# Altium footprint library Connectors.PcbLib: 155 footprints (part 5 of 10)
Each footprint in its own frame and in the unit in brackets; x right, y up, seen from the top. Pads: shape width x height; smd on the part's side, far side on the other; paste and mask are expansions set on the pad; w line width, h text height; cw(c..) or ccw(c..) is an arc to the next point about the centre after c.
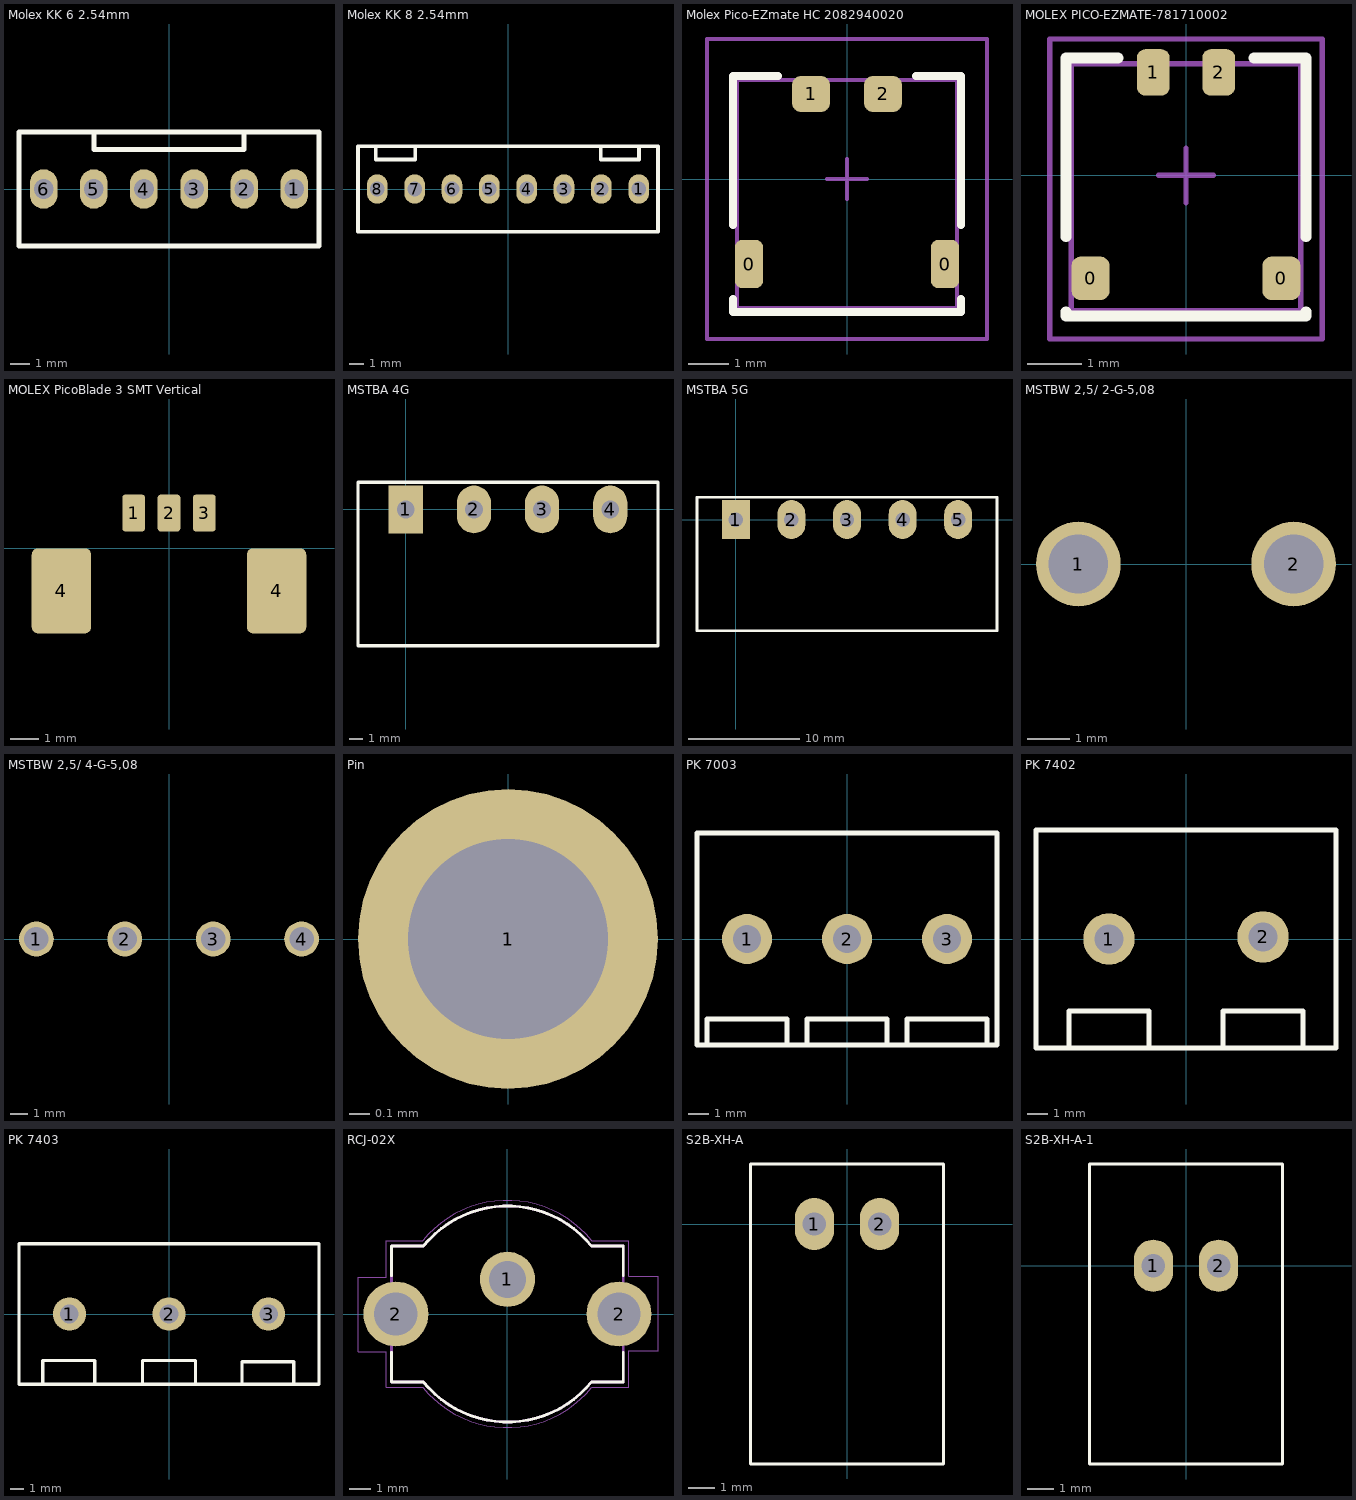
[diagram p4: the footprints below, top view; thin cyan lines are the x and y axes]

## Molex KK 6 2.54mm [mm] "Molex KK 6 2.54mm"
height 11.7
pads (6):
  oval 1.4x2 hole 1: 1(6.35,0) 2(3.81,0) 3(1.27,0) 4(-1.27,0) 5(-3.81,0) 6(-6.35,0)
Top Overlay:
  lines w0.254: -3.8,2.9 -3.8,2 3.8,2 3.8,2.9 ; -7.6,-2.9 -7.6,2.9 7.6,2.9 7.6,-2.9 -7.6,-2.9
3D body: height 11.72, standoff -3.54, extent -7.6,-2.9 7.64,2.9

## Molex KK 8 2.54mm [mm] "Molex KK 8 2.54mm"
height 11.7
pads (8):
  oval 1.4x2 hole 1: 1(8.89,0) 2(6.35,0) 3(3.81,0) 4(1.27,0) 5(-1.27,0) 6(-3.81,0) 7(-6.35,0) 8(-8.89,0)
Top Overlay:
  lines w0.254: -9,2.9 -9,2 -6.3,2 -6.3,2.9 ; 6.3,2.9 6.3,2 8.9,2 8.9,2.9 ; -10.2,-2.9 -10.2,2.9 10.2,2.9 10.2,-2.9 -10.2,-2.9
3D body: height 11.72, standoff -3.54, extent -10.16,-2.9 10.16,2.9

## Molex Pico-EZmate HC 2082940020 [mm]
height 1.65
pads (4):
  rrect50% 0.7x1.2 smd: 0(-2.45,-2.125) 0(2.45,-2.125)
  rrect50% 0.95x0.9 smd: 1(-0.9,2.125) 2(0.9,2.125)
Top Overlay:
  lines w0.2: -2.85,-3.325 -2.85,-3 ; -2.85,-1.15 -2.85,2.575 -1.725,2.575 ; -2.8,-3.325 2.85,-3.325 2.85,-3 ; 1.725,2.575 2.85,2.575 2.85,-1.15
Mechanical 13:
  lines w0.1: -2.75,-3.225 2.75,-3.225 2.75,2.475 -2.75,2.475 -2.75,-3.225
Mechanical 15:
  lines w0.1: -0.5,0 0.5,0 ; 0,-0.5 0,0.5 ; -3.5,-4 3.5,-4 3.5,3.5 -3.5,3.5 -3.5,-4
3D body: height 1.55, standoff -0.05, extent -2.75,-3.225 2.75,2.475

## MOLEX PICO-EZMATE-781710002 [mm] "1.20mm Pitch, Pico-EZmate PCB Header, Single Row, Gold Plating, Friction Lock, 2 Circuits, Tape and Reel"
height 1.55
pads (4):
  rrect50% 0.7x0.8 smd: 0(-1.75,-1.887) 0(1.75,-1.887)
  rrect50% 0.6x0.85 smd: 1(-0.6,1.887) 2(0.6,1.887)
Top Overlay:
  lines w0.2: -2.2,-2.5 -2.2,-2.575 2.2,-2.575 2.2,-2.5 ; -2.2,-1.125 -2.2,2.15 -1.25,2.15 ; 1.25,2.15 2.2,2.15 2.2,-1.125
Mechanical 13:
  lines w0.1: -2.1,-2.485 2.1,-2.485 2.1,2.045 -2.1,2.045 -2.1,-2.485
Mechanical 15:
  lines w0.1: -0.5,0 0.5,0 ; 0,-0.5 0,0.5 ; -2.5,-3 -2.5,2.5 2.5,2.5 2.5,-3 -2.5,-3
3D body: height 1.4, standoff -0.05, extent -2.1,-2.485 2.1,2.045

## MOLEX PicoBlade 3 SMT Vertical [mm] "53398-0371"
height 4.7
pads (5):
  rrect25% 0.8x1.3 smd: 1(-1.25,1.25) 2(0,1.25) 3(1.25,1.25)
  rrect20% 2.1x3 smd: 4(-3.8,-1.5) 4(3.8,-1.5)
3D body: height 4.72, standoff 0.02, extent -4.45,-2.625 4.45,1.575

## MSTBA 4G [mm] "MSTBA 4G"
height 6
pads (4):
  rect 2.5x3.5 hole 1.3: 1(0,0)
  oval 2.5x3.5 hole 1.3: 2(5,0) 3(10,0) 4(15,0)
Top Overlay:
  lines w0.254: -3.5,-10 -3,-10 18.5,-10 18.5,2 -3.5,2 -3.5,-10
3D body: height 8.6, standoff -3.5, extent -3.5,-10 18.5,2

## MSTBA 5G [mm] "MSTBA 5G"
height 6
pads (5):
  rect 2.5x3.5 hole 1.3: 1(0,0)
  oval 2.5x3.5 hole 1.3: 2(5,0) 3(10,0) 4(15,0) 5(20,0)
Top Overlay:
  lines w0.254: -3.5,-10 -3,-10 23.5,-10 23.5,2 -3.5,2 -3.5,-10
3D body: height 8.6, standoff -3.5, extent -3.5,-10 23.5,2

## MSTBW 2,5/ 2-G-5,08 [mm] "MSTBW 2,5/ 2-G-5,08 PCB header with extended standoff"
height 12.42
pads (2):
  round 2 hole 1.4: 1(-2.54,0) 2(2.54,0)
3D body: height 12.42, standoff -3.5, extent -5.08,-10 5.08,2

## MSTBW 2,5/ 4-G-5,08 [mm] "MSTBW 2,5/ 4-G-5,08 PCB header with extended standoff"
height 12.42
pads (4):
  round 2 hole 1.4: 1(-7.62,0) 2(-2.54,0) 3(2.54,0) 4(7.62,0)
3D body: height 12.42, standoff -3.5, extent -10.16,-10 10.16,2

## Pin [mm] "Simple pin"
pads (1):
  round 1.5 hole 1: 1(0,0)

## PK 7003 [mm] "PK 7003"
height 19
pads (3):
  round 2.5 hole 1.4: 1(-5,0) 2(0,0) 3(5,0)
Top Overlay:
  lines w0.254: -7,-5.3 -7,-4 -3,-4 -3,-5.3 ; -2,-5.3 -2,-4 2,-4 2,-5.3 ; 3,-5.3 3,-4 7,-4 7,-5.3 ; -7.5,-5.3 -7.5,5.3 7.5,5.3 7.5,-5.3 -7.5,-5.3
3D body: height 19, standoff -1, extent -7.5,-5.25 7.5,5.25

## PK 7402 [mm] "PK 7402"
height 19
pads (2):
  round 2.5 hole 1.4: 1(-3.75,0) 2(3.75,0.1)
Top Overlay:
  lines w0.254: -5.7,-5.3 -5.7,-3.5 -1.8,-3.5 -1.8,-5.3 ; 1.8,-5.3 1.8,-3.5 5.7,-3.5 5.7,-5.3 ; -7.3,-5.3 7.3,-5.3 7.3,5.3 -7.3,5.3 -7.3,-5.3
3D body: height 19, standoff -1, extent -7.25,-5.25 7.25,5.25

## PK 7403 [mm] "PK 7403"
height 19
pads (3):
  round 2.5 hole 1.4: 1(-7.5,0) 2(0,0) 3(7.5,0)
Top Overlay:
  lines w0.254: -9.5,-5.3 -9.5,-3.5 -5.6,-3.5 -5.6,-5.3 ; -2,-5.3 -2,-3.5 0,-3.5 1.7,-3.5 2,-3.5 2,-5.3 ; 5.5,-5.3 5.5,-3.6 9.4,-3.6 9.4,-5.3 ; -11.3,-5.3 -11.3,5.3 11.3,5.3 11.3,-5.3 -11.3,-5.3
3D body: height 19, standoff -1, extent -11.25,-5.25 11.25,5.25

## RCJ-02X [mm] "RCA connector"
height 15.8
pads (3):
  round 2.55 hole 1.7: 1(0,1.6)
  round 3 hole 2: 2(-5.15,0) 2(5.15,0)
Top Overlay:
  lines w0.127: -5.35,-1.765 -5.35,-3.135 -3.884,-3.135 ; -5.35,1.765 -5.35,3.135 -3.884,3.135 ; -3.886,-3.133 ccw(c0,0.014) 3.886,-3.133 ; -3.886,3.133 cw(c0,-0.014) 3.886,3.133 ; 3.884,3.135 5.35,3.135 5.35,1.765 ; 3.904,-3.135 5.35,-3.135 5.35,-1.765
Mechanical 13:
  lines w0.127: -3.886,-3.133 ccw(c0,0.014) 3.886,-3.133 ; -3.886,3.133 cw(c0,-0.014) 3.886,3.133 ; -3.884,-3.135 -5.35,-3.135 -5.35,3.135 -3.884,3.135 ; 3.884,3.135 5.35,3.135 5.35,-3.135 3.904,-3.135
Mechanical 15:
  lines w0.05: -5.605,3.385 -5.6,3.385 ; -3.905,3.383 cw(c-0.004,0.224) 3.897,3.383 ; -3.903,-3.383 ccw(c-0.002,-0.224) 3.899,-3.383 ; -3.903,3.385 -5.6,3.385 ; -3.901,-3.385 -5.6,-3.385 -5.6,-1.75 -6.9,-1.75 -6.9,1.7 -5.6,1.7 -5.6,3.385 ; 3.895,3.385 5.6,3.385 5.6,1.75 6.95,1.75 6.95,-1.7 5.6,-1.7 5.6,-3.385 3.904,-3.385
3D body: height 15.95, standoff -6.15, extent -6.477,-5 6.477,5

## S2B-XH-A [mm] "JST XH 2.5mm pitch, 2pin, right angle"
height 6.1
pads (2):
  oval 1.5x2 hole 0.9 unplated: 1(-1.25,0) 2(1.25,0)
Top Overlay:
  lines w0.1: -3.7,-9.2 -3.7,2.3 3.7,2.3 3.7,-9.2 -3.7,-9.2
3D body: height 5.95, standoff -3.4, extent -3.7,-9.2 3.7,2.3

## S2B-XH-A-1 [mm] "JST XH 2.5mm pitch, 2pin, right angle"
height 6.1
pads (2):
  oval 1.5x2 hole 0.9 unplated: 1(-1.25,0) 2(1.25,0)
Top Overlay:
  lines w0.1: -3.7,-7.6 3.7,-7.6 3.7,3.9 -3.7,3.9 -3.7,-7.6
3D body: height 5.95, standoff -3.4, extent -3.7,-7.6 3.7,3.9